# Altium footprint library pcb_PassiveInd.PcbLib: 58 footprints (part 4 of 4)
Each footprint in its own frame and in the unit in brackets; x right, y up, seen from the top. Pads: shape width x height; smd on the part's side, far side on the other; paste and mask are expansions set on the pad; w line width, h text height; cw(c..) or ccw(c..) is an arc to the next point about the centre after c.
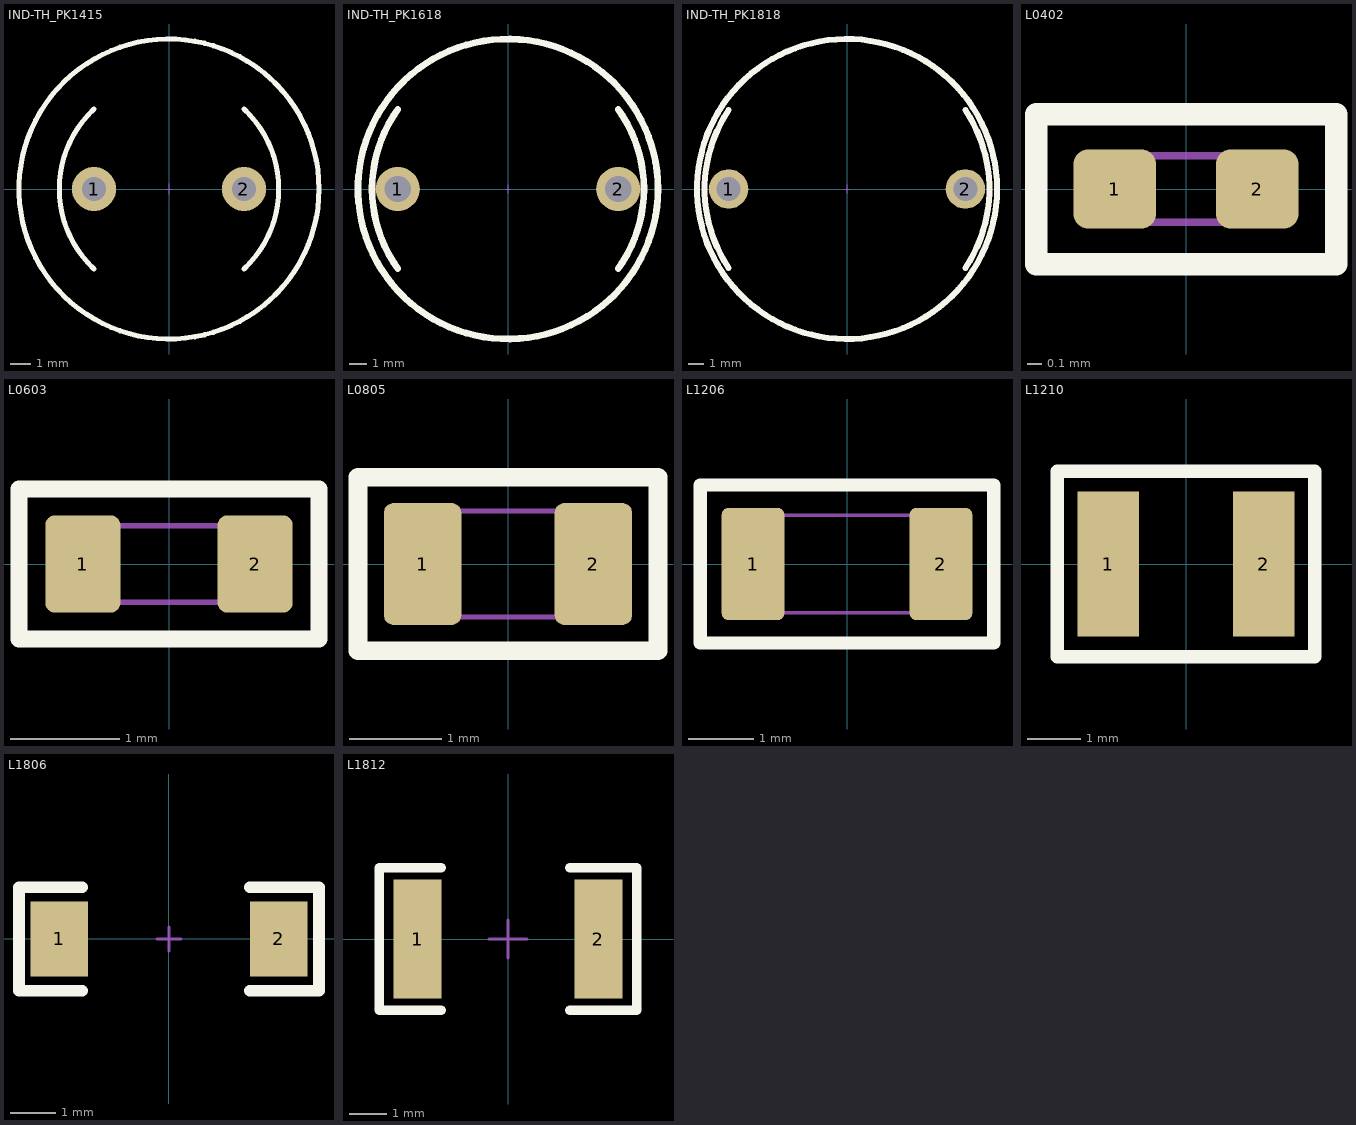
[diagram p3: the footprints below, top view; thin cyan lines are the x and y axes]

## IND-TH_PK1415 [mm] "7.5*15*17mm(脚距，直径，高）"
pads (2):
  round 2.2 hole 1.2: 1(-3.75,0) 2(3.75,0)
Top Overlay:
  circle w0.254: c0,0 r7.5
  lines w0.254: -3.75,-4 cw(c0,0) -3.75,4 ; 3.75,-4 ccw(c0,0) 3.75,4
Mechanical 15:
  lines w0.01: -0.127,0 0.127,0 ; 0,-0.254 0,0.254
Mechanical 16:
  text ".Designator" at 0,0 h1
3D body "PK1415.STEP": height 17.02, standoff -2.78, extent -7.5,-7.5 7.5,7.5

## IND-TH_PK1618 [mm] "12.5*17*20mm(脚距，直径，高）"
pads (2):
  round 2.5 hole 1.5: 1(-6.25,0) 2(6.25,0)
Top Overlay:
  circle w0.381: c0,0 r8.5
  lines w0.381: -6.25,-4.5 cw(c0,0) -6.25,4.5 ; 6.25,-4.5 ccw(c0,0) 6.25,4.5
Mechanical 15:
  lines w0.01: -0.127,0 0.127,0 ; 0,-0.254 0,0.254
Mechanical 16:
  text ".Designator" at 0,0 h1
3D body "PK1618.STEP": height 20.02, standoff -2.78, extent -8.5,-8.488 8.5,8.488

## IND-TH_PK1818 [mm] "15*19*20mm(脚距，直径，高） 工字电感"
pads (2):
  round 2.5 hole 1.5: 1(-7.5,0) 2(7.5,0)
Top Overlay:
  circle w0.381: c0,0 r9.5
  lines w0.381: -7.5,-5 cw(c0,0) -7.5,5 ; 7.5,-5 ccw(c0,0) 7.5,5
Mechanical 15:
  lines w0.01: -0.127,0 0.127,0 ; 0,-0.254 0,0.254
Mechanical 16:
  text ".Designator" at 0,0 h1
3D body "PK1818.STEP": height 20.02, standoff -2.78, extent -9.5,-9.488 9.5,9.488

## L0402 [mil]
pads (2):
  rrect36% 22x21 smd mask+3: 1(-19,0) 2(19,0)
Top Overlay:
  lines w6: -40,-20 40,-20 40,20 -40,20 -40,-20
Mechanical 11:
  lines w2.01: -18.7,-8.86 -18.7,8.86 18.7,8.86 18.7,-8.86 -18.7,-8.86
Mechanical 16:
  text ".Designator" at 0,0 h39.37
3D body "INDC1005X05L.step": height 19.68, standoff 0, extent -19.68,-9.84 19.69,9.85

## L0603 [mil]
pads (2):
  rrect25% 27x35 smd mask+3: 1(-31,0) 2(31,0)
Top Overlay:
  lines w6: -54,-27 -54,27 54,27 54,-27 -54,-27
Mechanical 11:
  lines w2.01: -29.53,-13.78 -29.53,13.78 29.53,13.78 29.53,-13.78 -29.53,-13.78
Mechanical 16:
  text ".Designator" at 0,0 h39.37
3D body "INDC1608X08L.step": height 31.5, standoff 0, extent -31.5,-15.75 31.5,15.75

## L0805 [mil]
pads (2):
  rrect24% 33x52 smd mask+3: 1(-36.42,0) 2(36.42,0)
Top Overlay:
  lines w8: -64,-37 64,-37 64,37 -64,37 -64,-37
Mechanical 11:
  lines w2.01: -37.4,-22.64 -37.4,22.64 37.4,22.64 37.4,-22.64 -37.4,-22.64
Mechanical 16:
  text ".Designator" at 0,0 h39.37
3D body "INDC2012X10L.step": height 39.37, standoff 0, extent -39.37,-24.61 39.37,24.61

## L1206 [mil]
pads (2):
  rrect20% 38x68 smd: 1(-57,0) 2(57,0)
Top Overlay:
  lines w8: -89,-48 -89,48 89,48 89,-48 -89,-48
Mechanical 11:
  lines w2.01: -59.06,-29.53 59.06,-29.53 59.06,29.53 -59.06,29.53 -59.06,-29.53
Mechanical 16:
  text ".Designator" at 0,0 h39.37
3D body "INDC3216X130N EIA 1206.step": height 51.18, standoff 0, extent -62.99,-31.5 62.99,31.5

## L1210 [mm] "小功率贴片电感"
pads (2):
  rect 1.15x2.7 smd: 1(-1.45,0) 2(1.45,0)
Top Overlay:
  lines w0.254: -2.4,-1.73 2.4,-1.73 2.4,1.73 -2.4,1.73 -2.4,-1.73
Mechanical 16:
  text ".Designator" at 0,0 h1
3D body "1210.STEP": height 1.3, standoff 0, extent -1.6,-1.25 1.6,1.25

## L1806 [mil] "小功率贴片电感"
pads (2):
  rect 50x65 smd: 1(-95,0) 2(95,0)
Top Overlay:
  lines w10: -75,-45 -130,-45 -130,45 -75,45 ; 70,-45 130,-45 130,-40 130,-15 130,45 70,45
Mechanical 15:
  lines w3: -10,0 10,0 ; 0,-10 0,10
Mechanical 16:
  text ".Designator" at 0,0 h39.37
3D body "1806.STEP": height 62.99, standoff -0.19, extent -88.58,-31.5 88.58,31.5

## L1812 [mil] "小功率贴片电感"
pads (2):
  rect 50x125 smd: 1(-95,0) 2(95,0)
Top Overlay:
  lines w10: -70,-75 -135,-75 -135,75 -70,75 ; 65,-75 135,-75 135,75 65,75
Mechanical 15:
  lines w3: -20,0 20,0 ; 0,-20 0,20
Mechanical 16:
  text ".Designator" at 0,0 h39.37
3D body "1812.STEP": height 59.06, standoff -0.19, extent -88.58,-62.99 88.58,62.99